# Altium schematic symbol library jlcpcb_2025_04_capacitors_extended_1206.schlib: 2503 symbols (part 6 of 14) (continued)
## CC1206FRNPO9BN471
designator C?  Capacitance: 470pF  (hidden comment: *)
Capacitor, Ceramic (MLCC), 470pF, ±1%, 50V, NP0, ±1%, SMD 1206; Manufacturer: YAGEO; Manufacturer Part Number: CC1206FRNPO9BN471; Package Size: 1206; JLCPCB Basic Part: No; JLCPCB Part Number: C541587; Supplier 1: LCSC; Category: Capacitors - MLCC; Supplier Part Number 1: C541587; Tolerance: ±1%; Voltage Rating: 50V; Temperature Coefficient: NP0; RoHS: Yes; ComponentLink1Description: Datasheet; ComponentLink1URL: https://wmsc.lcsc.com/wmsc/upload/file/pdf/v2/lcsc/2006151213_YAGEO-CC1206FRNPO9BN471_C541587.pdf; ComponentLink2Description: JLCPCB Part URL; ComponentLink2URL: https://jlcpcb.com/partdetail/C541587; ComponentLink3Description: LCSC Part URL; ComponentLink3URL: https://lcsc.com/product-detail/Multilayer-Ceramic-Capacitors-MLCC---SMD-SMT_YAGEO-YAGEO-CC1206FRNPO9BN471_C541587.html
footprint CAP-1206 (1206 (3216M) Capacitor)
pins: 1, 2

## CC1206FRNPO9BN681
designator C?  Capacitance: 680pF  (hidden comment: *)
Capacitor, Ceramic (MLCC), 680pF, 50V, NP0, SMD 1206; Manufacturer: YAGEO; Manufacturer Part Number: CC1206FRNPO9BN681; Package Size: 1206; JLCPCB Basic Part: No; JLCPCB Part Number: C541589; Supplier 1: LCSC; Category: Capacitors - MLCC; Supplier Part Number 1: C541589; Voltage Rating: 50V; Temperature Coefficient: NP0; RoHS: Yes; ComponentLink1Description: Datasheet; ComponentLink1URL: https://wmsc.lcsc.com/wmsc/upload/file/pdf/v2/lcsc/2006151214_YAGEO-CC1206FRNPO9BN681_C541589.pdf; ComponentLink2Description: JLCPCB Part URL; ComponentLink2URL: https://jlcpcb.com/partdetail/C541589; ComponentLink3Description: LCSC Part URL; ComponentLink3URL: https://lcsc.com/product-detail/Multilayer-Ceramic-Capacitors-MLCC---SMD-SMT_YAGEO-YAGEO-CC1206FRNPO9BN681_C541589.html
footprint CAP-1206 (1206 (3216M) Capacitor)
pins: 1, 2

## CC1206GRNPO0BN102
designator C?  Capacitance: 1nF  (hidden comment: *)
Capacitor, Ceramic (MLCC), 1nF, ±2%, 100V, NP0, ±2%, SMD 1206; Manufacturer: YAGEO; Manufacturer Part Number: CC1206GRNPO0BN102; Package Size: 1206; JLCPCB Basic Part: No; JLCPCB Part Number: C527244; Supplier 1: LCSC; Category: Capacitors - MLCC; Supplier Part Number 1: C527244; Tolerance: ±2%; Voltage Rating: 100V; Temperature Coefficient: NP0; RoHS: Yes; ComponentLink1Description: Datasheet; ComponentLink1URL: https://wmsc.lcsc.com/wmsc/upload/file/pdf/v2/lcsc/2006181535_YAGEO-CC1206GRNPO0BN102_C527244.pdf; ComponentLink2Description: JLCPCB Part URL; ComponentLink2URL: https://jlcpcb.com/partdetail/C527244; ComponentLink3Description: LCSC Part URL; ComponentLink3URL: https://lcsc.com/product-detail/Multilayer-Ceramic-Capacitors-MLCC---SMD-SMT_YAGEO-YAGEO-CC1206GRNPO0BN102_C527244.html
footprint CAP-1206 (1206 (3216M) Capacitor)
pins: 1, 2

## CC1206GRNPO0BN222
designator C?  Capacitance: 2.2nF  (hidden comment: *)
Capacitor, Ceramic (MLCC), 2.2nF, ±2%, 100V, NP0, ±2%, SMD 1206; Manufacturer: YAGEO; Manufacturer Part Number: CC1206GRNPO0BN222; Package Size: 1206; JLCPCB Basic Part: No; JLCPCB Part Number: C527245; Supplier 1: LCSC; Category: Capacitors - MLCC; Supplier Part Number 1: C527245; Tolerance: ±2%; Voltage Rating: 100V; Temperature Coefficient: NP0; RoHS: Yes; ComponentLink1Description: Datasheet; ComponentLink1URL: https://wmsc.lcsc.com/wmsc/upload/file/pdf/v2/lcsc/2005261833_YAGEO-CC1206GRNPO0BN222_C527245.pdf; ComponentLink2Description: JLCPCB Part URL; ComponentLink2URL: https://jlcpcb.com/partdetail/C527245; ComponentLink3Description: LCSC Part URL; ComponentLink3URL: https://lcsc.com/product-detail/Multilayer-Ceramic-Capacitors-MLCC---SMD-SMT_YAGEO-YAGEO-CC1206GRNPO0BN222_C527245.html
footprint CAP-1206 (1206 (3216M) Capacitor)
pins: 1, 2

## CC1206GRNPO9BN100
designator C?  Capacitance: 10pF  (hidden comment: *)
Capacitor, Ceramic (MLCC), 10pF, ±2%, 50V, NP0, ±2%, SMD 1206; Manufacturer: YAGEO; Manufacturer Part Number: CC1206GRNPO9BN100; Package Size: 1206; JLCPCB Basic Part: No; JLCPCB Part Number: C541505; Supplier 1: LCSC; Category: Capacitors - MLCC; Supplier Part Number 1: C541505; Tolerance: ±2%; Voltage Rating: 50V; Temperature Coefficient: NP0; RoHS: Yes; ComponentLink1Description: Datasheet; ComponentLink1URL: https://wmsc.lcsc.com/wmsc/upload/file/pdf/v2/lcsc/2006151141_YAGEO-CC1206GRNPO9BN100_C541505.pdf; ComponentLink2Description: JLCPCB Part URL; ComponentLink2URL: https://jlcpcb.com/partdetail/C541505; ComponentLink3Description: LCSC Part URL; ComponentLink3URL: https://lcsc.com/product-detail/Multilayer-Ceramic-Capacitors-MLCC---SMD-SMT_YAGEO-YAGEO-CC1206GRNPO9BN100_C541505.html
footprint CAP-1206 (1206 (3216M) Capacitor)
pins: 1, 2

## CC1206GRNPO9BN101
designator C?  Capacitance: 100pF  (hidden comment: *)
Capacitor, Ceramic (MLCC), 100pF, ±2%, 50V, NP0, ±2%, SMD 1206; Manufacturer: YAGEO; Manufacturer Part Number: CC1206GRNPO9BN101; Package Size: 1206; JLCPCB Basic Part: No; JLCPCB Part Number: C527246; Supplier 1: LCSC; Category: Capacitors - MLCC; Supplier Part Number 1: C527246; Tolerance: ±2%; Voltage Rating: 50V; Temperature Coefficient: NP0; RoHS: Yes; ComponentLink1Description: Datasheet; ComponentLink1URL: https://wmsc.lcsc.com/wmsc/upload/file/pdf/v2/lcsc/2008061533_YAGEO-CC1206GRNPO9BN101_C527246.pdf; ComponentLink2Description: JLCPCB Part URL; ComponentLink2URL: https://jlcpcb.com/partdetail/C527246; ComponentLink3Description: LCSC Part URL; ComponentLink3URL: https://lcsc.com/product-detail/Multilayer-Ceramic-Capacitors-MLCC---SMD-SMT_YAGEO-YAGEO-CC1206GRNPO9BN101_C527246.html
footprint CAP-1206 (1206 (3216M) Capacitor)
pins: 1, 2

## CC1206GRNPO9BN102
designator C?  Capacitance: 1nF  (hidden comment: *)
Capacitor, Ceramic (MLCC), 1nF, ±2%, 50V, NP0, ±2%, SMD 1206; Manufacturer: YAGEO; Manufacturer Part Number: CC1206GRNPO9BN102; Package Size: 1206; JLCPCB Basic Part: No; JLCPCB Part Number: C527247; Supplier 1: LCSC; Category: Capacitors - MLCC; Supplier Part Number 1: C527247; Tolerance: ±2%; Voltage Rating: 50V; Temperature Coefficient: NP0; RoHS: Yes; ComponentLink1Description: Datasheet; ComponentLink1URL: https://wmsc.lcsc.com/wmsc/upload/file/pdf/v2/lcsc/2005222142_YAGEO-CC1206GRNPO9BN102_C527247.pdf; ComponentLink2Description: JLCPCB Part URL; ComponentLink2URL: https://jlcpcb.com/partdetail/C527247; ComponentLink3Description: LCSC Part URL; ComponentLink3URL: https://lcsc.com/product-detail/Multilayer-Ceramic-Capacitors-MLCC---SMD-SMT_YAGEO-YAGEO-CC1206GRNPO9BN102_C527247.html
footprint CAP-1206 (1206 (3216M) Capacitor)
pins: 1, 2

## CC1206GRNPO9BN122
designator C?  Capacitance: 1.2nF  (hidden comment: *)
Capacitor, Ceramic (MLCC), 1.2nF, ±2%, 50V, NP0, ±2%, SMD 1206; Manufacturer: YAGEO; Manufacturer Part Number: CC1206GRNPO9BN122; Package Size: 1206; JLCPCB Basic Part: No; JLCPCB Part Number: C527248; Supplier 1: LCSC; Category: Capacitors - MLCC; Supplier Part Number 1: C527248; Tolerance: ±2%; Voltage Rating: 50V; Temperature Coefficient: NP0; RoHS: Yes; ComponentLink1Description: Datasheet; ComponentLink1URL: https://wmsc.lcsc.com/wmsc/upload/file/pdf/v2/lcsc/2006181535_YAGEO-CC1206GRNPO9BN122_C527248.pdf; ComponentLink2Description: JLCPCB Part URL; ComponentLink2URL: https://jlcpcb.com/partdetail/C527248; ComponentLink3Description: LCSC Part URL; ComponentLink3URL: https://lcsc.com/product-detail/Multilayer-Ceramic-Capacitors-MLCC---SMD-SMT_YAGEO-YAGEO-CC1206GRNPO9BN122_C527248.html
footprint CAP-1206 (1206 (3216M) Capacitor)
pins: 1, 2

## CC1206GRNPO9BN152
designator C?  Capacitance: 1.5nF  (hidden comment: *)
Capacitor, Ceramic (MLCC), 1.5nF, ±2%, 50V, NP0, ±2%, SMD 1206; Manufacturer: YAGEO; Manufacturer Part Number: CC1206GRNPO9BN152; Package Size: 1206; JLCPCB Basic Part: No; JLCPCB Part Number: C527249; Supplier 1: LCSC; Category: Capacitors - MLCC; Supplier Part Number 1: C527249; Tolerance: ±2%; Voltage Rating: 50V; Temperature Coefficient: NP0; RoHS: Yes; ComponentLink1Description: Datasheet; ComponentLink1URL: https://wmsc.lcsc.com/wmsc/upload/file/pdf/v2/lcsc/2007021836_YAGEO-CC1206GRNPO9BN152_C527249.pdf; ComponentLink2Description: JLCPCB Part URL; ComponentLink2URL: https://jlcpcb.com/partdetail/C527249; ComponentLink3Description: LCSC Part URL; ComponentLink3URL: https://lcsc.com/product-detail/Multilayer-Ceramic-Capacitors-MLCC---SMD-SMT_YAGEO-YAGEO-CC1206GRNPO9BN152_C527249.html
footprint CAP-1206 (1206 (3216M) Capacitor)
pins: 1, 2

## CC1206GRNPO9BN181
designator C?  Capacitance: 180pF  (hidden comment: *)
Capacitor, Ceramic (MLCC), 180pF, ±2%, 50V, NP0, ±2%, SMD 1206; Manufacturer: YAGEO; Manufacturer Part Number: CC1206GRNPO9BN181; Package Size: 1206; JLCPCB Basic Part: No; JLCPCB Part Number: C577104; Supplier 1: LCSC; Category: Capacitors - MLCC; Supplier Part Number 1: C577104; Tolerance: ±2%; Voltage Rating: 50V; Temperature Coefficient: NP0; RoHS: Yes; ComponentLink1Description: Datasheet; ComponentLink1URL: https://wmsc.lcsc.com/wmsc/upload/file/pdf/v2/lcsc/2311211121_YAGEO-CC1206GRNPO9BN181_C577104.pdf; ComponentLink2Description: JLCPCB Part URL; ComponentLink2URL: https://jlcpcb.com/partdetail/C577104; ComponentLink3Description: LCSC Part URL; ComponentLink3URL: https://lcsc.com/product-detail/Multilayer-Ceramic-Capacitors-MLCC---SMD-SMT_YAGEO-YAGEO-CC1206GRNPO9BN181_C577104.html
footprint CAP-1206 (1206 (3216M) Capacitor)
pins: 1, 2

## CC1206GRNPO9BN182
designator C?  Capacitance: 1.8nF  (hidden comment: *)
Capacitor, Ceramic (MLCC), 1.8nF, ±2%, 50V, NP0, ±2%, SMD 1206; Manufacturer: YAGEO; Manufacturer Part Number: CC1206GRNPO9BN182; Package Size: 1206; JLCPCB Basic Part: No; JLCPCB Part Number: C527250; Supplier 1: LCSC; Category: Capacitors - MLCC; Supplier Part Number 1: C527250; Tolerance: ±2%; Voltage Rating: 50V; Temperature Coefficient: NP0; RoHS: Yes; ComponentLink1Description: Datasheet; ComponentLink1URL: https://wmsc.lcsc.com/wmsc/upload/file/pdf/v2/lcsc/2006031835_YAGEO-CC1206GRNPO9BN182_C527250.pdf; ComponentLink2Description: JLCPCB Part URL; ComponentLink2URL: https://jlcpcb.com/partdetail/C527250; ComponentLink3Description: LCSC Part URL; ComponentLink3URL: https://lcsc.com/product-detail/Multilayer-Ceramic-Capacitors-MLCC---SMD-SMT_YAGEO-YAGEO-CC1206GRNPO9BN182_C527250.html
footprint CAP-1206 (1206 (3216M) Capacitor)
pins: 1, 2

## CC1206GRNPO9BN220
designator C?  Capacitance: 22pF  (hidden comment: *)
Capacitor, Ceramic (MLCC), 22pF, ±2%, 50V, NP0, ±2%, SMD 1206; Manufacturer: YAGEO; Manufacturer Part Number: CC1206GRNPO9BN220; Package Size: 1206; JLCPCB Basic Part: No; JLCPCB Part Number: C527251; Supplier 1: LCSC; Category: Capacitors - MLCC; Supplier Part Number 1: C527251; Tolerance: ±2%; Voltage Rating: 50V; Temperature Coefficient: NP0; RoHS: Yes; ComponentLink1Description: Datasheet; ComponentLink1URL: https://wmsc.lcsc.com/wmsc/upload/file/pdf/v2/lcsc/2007221234_YAGEO-CC1206GRNPO9BN220_C527251.pdf; ComponentLink2Description: JLCPCB Part URL; ComponentLink2URL: https://jlcpcb.com/partdetail/C527251; ComponentLink3Description: LCSC Part URL; ComponentLink3URL: https://lcsc.com/product-detail/Multilayer-Ceramic-Capacitors-MLCC---SMD-SMT_YAGEO-YAGEO-CC1206GRNPO9BN220_C527251.html
footprint CAP-1206 (1206 (3216M) Capacitor)
pins: 1, 2

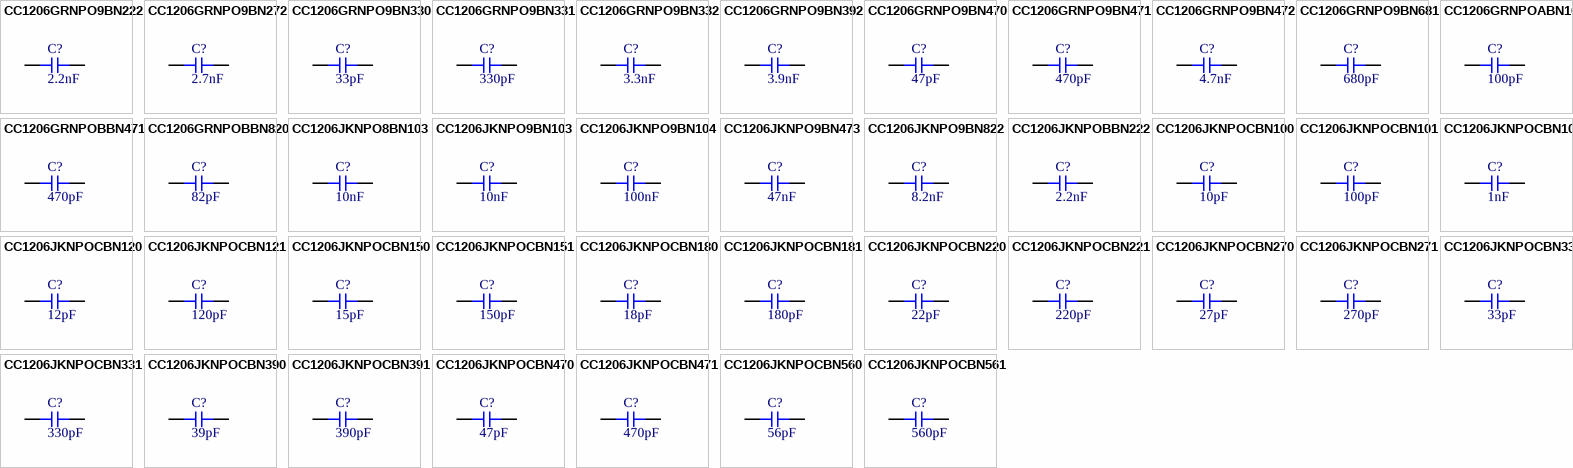
[diagram p24: symbols CC1206GRNPO9BN222 to CC1206JKNPOCBN561]

## CC1206GRNPO9BN222
designator C?  Capacitance: 2.2nF  (hidden comment: *)
Capacitor, Ceramic (MLCC), 2.2nF, ±2%, 50V, NP0, ±2%, SMD 1206; Manufacturer: YAGEO; Manufacturer Part Number: CC1206GRNPO9BN222; Package Size: 1206; JLCPCB Basic Part: No; JLCPCB Part Number: C527252; Supplier 1: LCSC; Category: Capacitors - MLCC; Supplier Part Number 1: C527252; Tolerance: ±2%; Voltage Rating: 50V; Temperature Coefficient: NP0; RoHS: Yes; ComponentLink1Description: Datasheet; ComponentLink1URL: https://wmsc.lcsc.com/wmsc/upload/file/pdf/v2/lcsc/2007301233_YAGEO-CC1206GRNPO9BN222_C527252.pdf; ComponentLink2Description: JLCPCB Part URL; ComponentLink2URL: https://jlcpcb.com/partdetail/C527252; ComponentLink3Description: LCSC Part URL; ComponentLink3URL: https://lcsc.com/product-detail/Multilayer-Ceramic-Capacitors-MLCC---SMD-SMT_YAGEO-YAGEO-CC1206GRNPO9BN222_C527252.html
footprint CAP-1206 (1206 (3216M) Capacitor)
pins: 1, 2

## CC1206GRNPO9BN272
designator C?  Capacitance: 2.7nF  (hidden comment: *)
Capacitor, Ceramic (MLCC), 2.7nF, ±2%, 50V, NP0, ±2%, SMD 1206; Manufacturer: YAGEO; Manufacturer Part Number: CC1206GRNPO9BN272; Package Size: 1206; JLCPCB Basic Part: No; JLCPCB Part Number: C541510; Supplier 1: LCSC; Category: Capacitors - MLCC; Supplier Part Number 1: C541510; Tolerance: ±2%; Voltage Rating: 50V; Temperature Coefficient: NP0; RoHS: Yes; ComponentLink1Description: Datasheet; ComponentLink1URL: https://wmsc.lcsc.com/wmsc/upload/file/pdf/v2/lcsc/2006151142_YAGEO-CC1206GRNPO9BN272_C541510.pdf; ComponentLink2Description: JLCPCB Part URL; ComponentLink2URL: https://jlcpcb.com/partdetail/C541510; ComponentLink3Description: LCSC Part URL; ComponentLink3URL: https://lcsc.com/product-detail/Multilayer-Ceramic-Capacitors-MLCC---SMD-SMT_YAGEO-YAGEO-CC1206GRNPO9BN272_C541510.html
footprint CAP-1206 (1206 (3216M) Capacitor)
pins: 1, 2

## CC1206GRNPO9BN330
designator C?  Capacitance: 33pF  (hidden comment: *)
Capacitor, Ceramic (MLCC), 33pF, ±2%, 50V, NP0, ±2%, SMD 1206; Manufacturer: YAGEO; Manufacturer Part Number: CC1206GRNPO9BN330; Package Size: 1206; JLCPCB Basic Part: No; JLCPCB Part Number: C541508; Supplier 1: LCSC; Category: Capacitors - MLCC; Supplier Part Number 1: C541508; Tolerance: ±2%; Voltage Rating: 50V; Temperature Coefficient: NP0; RoHS: Yes; ComponentLink1Description: Datasheet; ComponentLink1URL: https://wmsc.lcsc.com/wmsc/upload/file/pdf/v2/lcsc/2006151141_YAGEO-CC1206GRNPO9BN330_C541508.pdf; ComponentLink2Description: JLCPCB Part URL; ComponentLink2URL: https://jlcpcb.com/partdetail/C541508; ComponentLink3Description: LCSC Part URL; ComponentLink3URL: https://lcsc.com/product-detail/Multilayer-Ceramic-Capacitors-MLCC---SMD-SMT_YAGEO-YAGEO-CC1206GRNPO9BN330_C541508.html
footprint CAP-1206 (1206 (3216M) Capacitor)
pins: 1, 2

## CC1206GRNPO9BN331
designator C?  Capacitance: 330pF  (hidden comment: *)
Capacitor, Ceramic (MLCC), 330pF, ±2%, 50V, NP0, ±2%, SMD 1206; Manufacturer: YAGEO; Manufacturer Part Number: CC1206GRNPO9BN331; Package Size: 1206; JLCPCB Basic Part: No; JLCPCB Part Number: C527253; Supplier 1: LCSC; Category: Capacitors - MLCC; Supplier Part Number 1: C527253; Tolerance: ±2%; Voltage Rating: 50V; Temperature Coefficient: NP0; RoHS: Yes; ComponentLink1Description: Datasheet; ComponentLink1URL: https://wmsc.lcsc.com/wmsc/upload/file/pdf/v2/lcsc/2007021837_YAGEO-CC1206GRNPO9BN331_C527253.pdf; ComponentLink2Description: JLCPCB Part URL; ComponentLink2URL: https://jlcpcb.com/partdetail/C527253; ComponentLink3Description: LCSC Part URL; ComponentLink3URL: https://lcsc.com/product-detail/Multilayer-Ceramic-Capacitors-MLCC---SMD-SMT_YAGEO-YAGEO-CC1206GRNPO9BN331_C527253.html
footprint CAP-1206 (1206 (3216M) Capacitor)
pins: 1, 2

## CC1206GRNPO9BN332
designator C?  Capacitance: 3.3nF  (hidden comment: *)
Capacitor, Ceramic (MLCC), 3.3nF, ±2%, 50V, NP0, ±2%, SMD 1206; Manufacturer: YAGEO; Manufacturer Part Number: CC1206GRNPO9BN332; Package Size: 1206; JLCPCB Basic Part: No; JLCPCB Part Number: C541559; Supplier 1: LCSC; Category: Capacitors - MLCC; Supplier Part Number 1: C541559; Tolerance: ±2%; Voltage Rating: 50V; Temperature Coefficient: NP0; RoHS: Yes; ComponentLink1Description: Datasheet; ComponentLink1URL: https://wmsc.lcsc.com/wmsc/upload/file/pdf/v2/lcsc/2006151212_YAGEO-CC1206GRNPO9BN332_C541559.pdf; ComponentLink2Description: JLCPCB Part URL; ComponentLink2URL: https://jlcpcb.com/partdetail/C541559; ComponentLink3Description: LCSC Part URL; ComponentLink3URL: https://lcsc.com/product-detail/Multilayer-Ceramic-Capacitors-MLCC---SMD-SMT_YAGEO-YAGEO-CC1206GRNPO9BN332_C541559.html
footprint CAP-1206 (1206 (3216M) Capacitor)
pins: 1, 2

## CC1206GRNPO9BN392
designator C?  Capacitance: 3.9nF  (hidden comment: *)
Capacitor, Ceramic (MLCC), 3.9nF, ±2%, 50V, NP0, ±2%, SMD 1206; Manufacturer: YAGEO; Manufacturer Part Number: CC1206GRNPO9BN392; Package Size: 1206; JLCPCB Basic Part: No; JLCPCB Part Number: C541560; Supplier 1: LCSC; Category: Capacitors - MLCC; Supplier Part Number 1: C541560; Tolerance: ±2%; Voltage Rating: 50V; Temperature Coefficient: NP0; RoHS: Yes; ComponentLink1Description: Datasheet; ComponentLink1URL: https://wmsc.lcsc.com/wmsc/upload/file/pdf/v2/lcsc/2006151212_YAGEO-CC1206GRNPO9BN392_C541560.pdf; ComponentLink2Description: JLCPCB Part URL; ComponentLink2URL: https://jlcpcb.com/partdetail/C541560; ComponentLink3Description: LCSC Part URL; ComponentLink3URL: https://lcsc.com/product-detail/Multilayer-Ceramic-Capacitors-MLCC---SMD-SMT_YAGEO-YAGEO-CC1206GRNPO9BN392_C541560.html
footprint CAP-1206 (1206 (3216M) Capacitor)
pins: 1, 2

## CC1206GRNPO9BN470
designator C?  Capacitance: 47pF  (hidden comment: *)
Capacitor, Ceramic (MLCC), 47pF, ±2%, 50V, NP0, ±2%, SMD 1206; Manufacturer: YAGEO; Manufacturer Part Number: CC1206GRNPO9BN470; Package Size: 1206; JLCPCB Basic Part: No; JLCPCB Part Number: C527254; Supplier 1: LCSC; Category: Capacitors - MLCC; Supplier Part Number 1: C527254; Tolerance: ±2%; Voltage Rating: 50V; Temperature Coefficient: NP0; RoHS: Yes; ComponentLink1Description: Datasheet; ComponentLink1URL: https://wmsc.lcsc.com/wmsc/upload/file/pdf/v2/lcsc/2007221234_YAGEO-CC1206GRNPO9BN470_C527254.pdf; ComponentLink2Description: JLCPCB Part URL; ComponentLink2URL: https://jlcpcb.com/partdetail/C527254; ComponentLink3Description: LCSC Part URL; ComponentLink3URL: https://lcsc.com/product-detail/Multilayer-Ceramic-Capacitors-MLCC---SMD-SMT_YAGEO-YAGEO-CC1206GRNPO9BN470_C527254.html
footprint CAP-1206 (1206 (3216M) Capacitor)
pins: 1, 2

## CC1206GRNPO9BN471
designator C?  Capacitance: 470pF  (hidden comment: *)
Capacitor, Ceramic (MLCC), 470pF, ±2%, 50V, NP0, ±2%, SMD 1206; Manufacturer: YAGEO; Manufacturer Part Number: CC1206GRNPO9BN471; Package Size: 1206; JLCPCB Basic Part: No; JLCPCB Part Number: C527255; Supplier 1: LCSC; Category: Capacitors - MLCC; Supplier Part Number 1: C527255; Tolerance: ±2%; Voltage Rating: 50V; Temperature Coefficient: NP0; RoHS: Yes; ComponentLink1Description: Datasheet; ComponentLink1URL: https://wmsc.lcsc.com/wmsc/upload/file/pdf/v2/lcsc/2008061533_YAGEO-CC1206GRNPO9BN471_C527255.pdf; ComponentLink2Description: JLCPCB Part URL; ComponentLink2URL: https://jlcpcb.com/partdetail/C527255; ComponentLink3Description: LCSC Part URL; ComponentLink3URL: https://lcsc.com/product-detail/Multilayer-Ceramic-Capacitors-MLCC---SMD-SMT_YAGEO-YAGEO-CC1206GRNPO9BN471_C527255.html
footprint CAP-1206 (1206 (3216M) Capacitor)
pins: 1, 2

## CC1206GRNPO9BN472
designator C?  Capacitance: 4.7nF  (hidden comment: *)
Capacitor, Ceramic (MLCC), 4.7nF, ±2%, 50V, NP0, ±2%, SMD 1206; Manufacturer: YAGEO; Manufacturer Part Number: CC1206GRNPO9BN472; Package Size: 1206; JLCPCB Basic Part: No; JLCPCB Part Number: C541561; Supplier 1: LCSC; Category: Capacitors - MLCC; Supplier Part Number 1: C541561; Tolerance: ±2%; Voltage Rating: 50V; Temperature Coefficient: NP0; RoHS: Yes; ComponentLink1Description: Datasheet; ComponentLink1URL: https://wmsc.lcsc.com/wmsc/upload/file/pdf/v2/lcsc/2006151212_YAGEO-CC1206GRNPO9BN472_C541561.pdf; ComponentLink2Description: JLCPCB Part URL; ComponentLink2URL: https://jlcpcb.com/partdetail/C541561; ComponentLink3Description: LCSC Part URL; ComponentLink3URL: https://lcsc.com/product-detail/Multilayer-Ceramic-Capacitors-MLCC---SMD-SMT_YAGEO-YAGEO-CC1206GRNPO9BN472_C541561.html
footprint CAP-1206 (1206 (3216M) Capacitor)
pins: 1, 2

## CC1206GRNPO9BN681
designator C?  Capacitance: 680pF  (hidden comment: *)
Capacitor, Ceramic (MLCC), 680pF, ±2%, 50V, NP0, ±2%, SMD 1206; Manufacturer: YAGEO; Manufacturer Part Number: CC1206GRNPO9BN681; Package Size: 1206; JLCPCB Basic Part: No; JLCPCB Part Number: C527256; Supplier 1: LCSC; Category: Capacitors - MLCC; Supplier Part Number 1: C527256; Tolerance: ±2%; Voltage Rating: 50V; Temperature Coefficient: NP0; RoHS: Yes; ComponentLink1Description: Datasheet; ComponentLink1URL: https://wmsc.lcsc.com/wmsc/upload/file/pdf/v2/lcsc/2005261833_YAGEO-CC1206GRNPO9BN681_C527256.pdf; ComponentLink2Description: JLCPCB Part URL; ComponentLink2URL: https://jlcpcb.com/partdetail/C527256; ComponentLink3Description: LCSC Part URL; ComponentLink3URL: https://lcsc.com/product-detail/Multilayer-Ceramic-Capacitors-MLCC---SMD-SMT_YAGEO-YAGEO-CC1206GRNPO9BN681_C527256.html
footprint CAP-1206 (1206 (3216M) Capacitor)
pins: 1, 2

## CC1206GRNPOABN101
designator C?  Capacitance: 100pF  (hidden comment: *)
Capacitor, Ceramic (MLCC), 100pF, ±2%, 200V, NP0, ±2%, SMD 1206; Manufacturer: YAGEO; Manufacturer Part Number: CC1206GRNPOABN101; Package Size: 1206; JLCPCB Basic Part: No; JLCPCB Part Number: C527257; Supplier 1: LCSC; Category: Capacitors - MLCC; Supplier Part Number 1: C527257; Tolerance: ±2%; Voltage Rating: 200V; Temperature Coefficient: NP0; RoHS: Yes; ComponentLink1Description: Datasheet; ComponentLink1URL: https://wmsc.lcsc.com/wmsc/upload/file/pdf/v2/lcsc/2007021837_YAGEO-CC1206GRNPOABN101_C527257.pdf; ComponentLink2Description: JLCPCB Part URL; ComponentLink2URL: https://jlcpcb.com/partdetail/C527257; ComponentLink3Description: LCSC Part URL; ComponentLink3URL: https://lcsc.com/product-detail/Multilayer-Ceramic-Capacitors-MLCC---SMD-SMT_YAGEO-YAGEO-CC1206GRNPOABN101_C527257.html
footprint CAP-1206 (1206 (3216M) Capacitor)
pins: 1, 2

## CC1206GRNPOBBN471
designator C?  Capacitance: 470pF  (hidden comment: *)
Capacitor, Ceramic (MLCC), 470pF, ±2%, 500V, NP0, ±2%, SMD 1206; Manufacturer: YAGEO; Manufacturer Part Number: CC1206GRNPOBBN471; Package Size: 1206; JLCPCB Basic Part: No; JLCPCB Part Number: C309496; Supplier 1: LCSC; Category: Capacitors - MLCC; Supplier Part Number 1: C309496; Tolerance: ±2%; Voltage Rating: 500V; Temperature Coefficient: NP0; RoHS: Yes; ComponentLink1Description: Datasheet; ComponentLink1URL: https://wmsc.lcsc.com/wmsc/upload/file/pdf/v2/lcsc/2304140030_YAGEO-CC1206GRNPOBBN471_C309496.pdf; ComponentLink2Description: JLCPCB Part URL; ComponentLink2URL: https://jlcpcb.com/partdetail/C309496; ComponentLink3Description: LCSC Part URL; ComponentLink3URL: https://lcsc.com/product-detail/Multilayer-Ceramic-Capacitors-MLCC---SMD-SMT_YAGEO-YAGEO-CC1206GRNPOBBN471_C309496.html
footprint CAP-1206 (1206 (3216M) Capacitor)
pins: 1, 2

## CC1206GRNPOBBN820
designator C?  Capacitance: 82pF  (hidden comment: *)
Capacitor, Ceramic (MLCC), 82pF, ±2%, 500V, NP0, ±2%, SMD 1206; Manufacturer: YAGEO; Manufacturer Part Number: CC1206GRNPOBBN820; Package Size: 1206; JLCPCB Basic Part: No; JLCPCB Part Number: C527258; Supplier 1: LCSC; Category: Capacitors - MLCC; Supplier Part Number 1: C527258; Tolerance: ±2%; Voltage Rating: 500V; Temperature Coefficient: NP0; RoHS: Yes; ComponentLink1Description: Datasheet; ComponentLink1URL: https://wmsc.lcsc.com/wmsc/upload/file/pdf/v2/lcsc/2007301233_YAGEO-CC1206GRNPOBBN820_C527258.pdf; ComponentLink2Description: JLCPCB Part URL; ComponentLink2URL: https://jlcpcb.com/partdetail/C527258; ComponentLink3Description: LCSC Part URL; ComponentLink3URL: https://lcsc.com/product-detail/Multilayer-Ceramic-Capacitors-MLCC---SMD-SMT_YAGEO-YAGEO-CC1206GRNPOBBN820_C527258.html
footprint CAP-1206 (1206 (3216M) Capacitor)
pins: 1, 2

## CC1206JKNPO8BN103
designator C?  Capacitance: 10nF  (hidden comment: *)
Capacitor, Ceramic (MLCC), 10nF, ±5%, 25V, NP0, ±5%, SMD 1206; Manufacturer: YAGEO; Manufacturer Part Number: CC1206JKNPO8BN103; Package Size: 1206; JLCPCB Basic Part: No; JLCPCB Part Number: C541480; Supplier 1: LCSC; Category: Capacitors - MLCC; Supplier Part Number 1: C541480; Tolerance: ±5%; Voltage Rating: 25V; Temperature Coefficient: NP0; RoHS: Yes; ComponentLink1Description: Datasheet; ComponentLink1URL: https://wmsc.lcsc.com/wmsc/upload/file/pdf/v2/lcsc/2006151139_YAGEO-CC1206JKNPO8BN103_C541480.pdf; ComponentLink2Description: JLCPCB Part URL; ComponentLink2URL: https://jlcpcb.com/partdetail/C541480; ComponentLink3Description: LCSC Part URL; ComponentLink3URL: https://lcsc.com/product-detail/Multilayer-Ceramic-Capacitors-MLCC---SMD-SMT_YAGEO-YAGEO-CC1206JKNPO8BN103_C541480.html
footprint CAP-1206 (1206 (3216M) Capacitor)
pins: 1, 2

## CC1206JKNPO9BN103
designator C?  Capacitance: 10nF  (hidden comment: *)
Capacitor, Ceramic (MLCC), 10nF, ±5%, 50V, NP0, ±5%, SMD 1206; Manufacturer: YAGEO; Manufacturer Part Number: CC1206JKNPO9BN103; Package Size: 1206; JLCPCB Basic Part: No; JLCPCB Part Number: C326648; Supplier 1: LCSC; Category: Capacitors - MLCC; Supplier Part Number 1: C326648; Tolerance: ±5%; Voltage Rating: 50V; Temperature Coefficient: NP0; RoHS: Yes; ComponentLink1Description: Datasheet; ComponentLink1URL: https://wmsc.lcsc.com/wmsc/upload/file/pdf/v2/lcsc/1811141242_YAGEO-CC1206JKNPO9BN103_C326648.pdf; ComponentLink2Description: JLCPCB Part URL; ComponentLink2URL: https://jlcpcb.com/partdetail/C326648; ComponentLink3Description: LCSC Part URL; ComponentLink3URL: https://lcsc.com/product-detail/Multilayer-Ceramic-Capacitors-MLCC---SMD-SMT_YAGEO-YAGEO-CC1206JKNPO9BN103_C326648.html
footprint CAP-1206 (1206 (3216M) Capacitor)
pins: 1, 2

## CC1206JKNPO9BN104
designator C?  Capacitance: 100nF  (hidden comment: *)
Capacitor, Ceramic (MLCC), 100nF, ±5%, 50V, NP0, ±5%, SMD 1206; Manufacturer: YAGEO; Manufacturer Part Number: CC1206JKNPO9BN104; Package Size: 1206; JLCPCB Basic Part: No; JLCPCB Part Number: C577121; Supplier 1: LCSC; Category: Capacitors - MLCC; Supplier Part Number 1: C577121; Tolerance: ±5%; Voltage Rating: 50V; Temperature Coefficient: NP0; RoHS: Yes; ComponentLink1Description: Datasheet; ComponentLink1URL: https://wmsc.lcsc.com/wmsc/upload/file/pdf/v2/lcsc/2204271615_YAGEO-CC1206JKNPO9BN104_C577121.pdf; ComponentLink2Description: JLCPCB Part URL; ComponentLink2URL: https://jlcpcb.com/partdetail/C577121; ComponentLink3Description: LCSC Part URL; ComponentLink3URL: https://lcsc.com/product-detail/Multilayer-Ceramic-Capacitors-MLCC---SMD-SMT_YAGEO-YAGEO-CC1206JKNPO9BN104_C577121.html
footprint CAP-1206 (1206 (3216M) Capacitor)
pins: 1, 2

## CC1206JKNPO9BN473
designator C?  Capacitance: 47nF  (hidden comment: *)
Capacitor, Ceramic (MLCC), 47nF, ±5%, 50V, C0G, ±5%, SMD 1206; Manufacturer: YAGEO; Manufacturer Part Number: CC1206JKNPO9BN473; Package Size: 1206; JLCPCB Basic Part: No; JLCPCB Part Number: C3855647; Supplier 1: LCSC; Category: Capacitors - MLCC; Supplier Part Number 1: C3855647; Tolerance: ±5%; Voltage Rating: 50V; Temperature Coefficient: C0G; RoHS: Yes; ComponentLink1Description: Datasheet; ComponentLink1URL: https://wmsc.lcsc.com/wmsc/upload/file/pdf/v2/lcsc/2311211121_YAGEO-CC1206JKNPO9BN473_C3855647.pdf; ComponentLink2Description: JLCPCB Part URL; ComponentLink2URL: https://jlcpcb.com/partdetail/C3855647; ComponentLink3Description: LCSC Part URL; ComponentLink3URL: https://lcsc.com/product-detail/Multilayer-Ceramic-Capacitors-MLCC---SMD-SMT_YAGEO-YAGEO-CC1206JKNPO9BN473_C3855647.html
footprint CAP-1206 (1206 (3216M) Capacitor)
pins: 1, 2

## CC1206JKNPO9BN822
designator C?  Capacitance: 8.2nF  (hidden comment: *)
Capacitor, Ceramic (MLCC), 8.2nF, ±5%, 50V, NP0, ±5%, SMD 1206; Manufacturer: YAGEO; Manufacturer Part Number: CC1206JKNPO9BN822; Package Size: 1206; JLCPCB Basic Part: No; JLCPCB Part Number: C527260; Supplier 1: LCSC; Category: Capacitors - MLCC; Supplier Part Number 1: C527260; Tolerance: ±5%; Voltage Rating: 50V; Temperature Coefficient: NP0; RoHS: Yes; ComponentLink1Description: Datasheet; ComponentLink1URL: https://wmsc.lcsc.com/wmsc/upload/file/pdf/v2/lcsc/2006181535_YAGEO-CC1206JKNPO9BN822_C527260.pdf; ComponentLink2Description: JLCPCB Part URL; ComponentLink2URL: https://jlcpcb.com/partdetail/C527260; ComponentLink3Description: LCSC Part URL; ComponentLink3URL: https://lcsc.com/product-detail/Multilayer-Ceramic-Capacitors-MLCC---SMD-SMT_YAGEO-YAGEO-CC1206JKNPO9BN822_C527260.html
footprint CAP-1206 (1206 (3216M) Capacitor)
pins: 1, 2

## CC1206JKNPOBBN222
designator C?  Capacitance: 2.2nF  (hidden comment: *)
Capacitor, Ceramic (MLCC), 2.2nF, ±5%, 500V, NP0, ±5%, SMD 1206; Manufacturer: YAGEO; Manufacturer Part Number: CC1206JKNPOBBN222; Package Size: 1206; JLCPCB Basic Part: No; JLCPCB Part Number: C527261; Supplier 1: LCSC; Category: Capacitors - MLCC; Supplier Part Number 1: C527261; Tolerance: ±5%; Voltage Rating: 500V; Temperature Coefficient: NP0; RoHS: Yes; ComponentLink1Description: Datasheet; ComponentLink1URL: https://wmsc.lcsc.com/wmsc/upload/file/pdf/v2/lcsc/2007021837_YAGEO-CC1206JKNPOBBN222_C527261.pdf; ComponentLink2Description: JLCPCB Part URL; ComponentLink2URL: https://jlcpcb.com/partdetail/C527261; ComponentLink3Description: LCSC Part URL; ComponentLink3URL: https://lcsc.com/product-detail/Multilayer-Ceramic-Capacitors-MLCC---SMD-SMT_YAGEO-YAGEO-CC1206JKNPOBBN222_C527261.html
footprint CAP-1206 (1206 (3216M) Capacitor)
pins: 1, 2

## CC1206JKNPOCBN100
designator C?  Capacitance: 10pF  (hidden comment: *)
Capacitor, Ceramic (MLCC), 10pF, ±5%, 1kV, NP0, ±5%, SMD 1206; Manufacturer: YAGEO; Manufacturer Part Number: CC1206JKNPOCBN100; Package Size: 1206; JLCPCB Basic Part: No; JLCPCB Part Number: C107172; Supplier 1: LCSC; Category: Capacitors - MLCC; Supplier Part Number 1: C107172; Tolerance: ±5%; Voltage Rating: 1kV; Temperature Coefficient: NP0; RoHS: Yes; ComponentLink1Description: Datasheet; ComponentLink1URL: https://wmsc.lcsc.com/wmsc/upload/file/pdf/v2/lcsc/2304140030_YAGEO-CC1206JKNPOCBN100_C107172.pdf; ComponentLink2Description: JLCPCB Part URL; ComponentLink2URL: https://jlcpcb.com/partdetail/C107172; ComponentLink3Description: LCSC Part URL; ComponentLink3URL: https://lcsc.com/product-detail/Multilayer-Ceramic-Capacitors-MLCC---SMD-SMT_YAGEO-YAGEO-CC1206JKNPOCBN100_C107172.html
footprint CAP-1206 (1206 (3216M) Capacitor)
pins: 1, 2

## CC1206JKNPOCBN101
designator C?  Capacitance: 100pF  (hidden comment: *)
Capacitor, Ceramic (MLCC), 100pF, ±5%, 1kV, NP0, ±5%, SMD 1206; Manufacturer: YAGEO; Manufacturer Part Number: CC1206JKNPOCBN101; Package Size: 1206; JLCPCB Basic Part: No; JLCPCB Part Number: C107173; Supplier 1: LCSC; Category: Capacitors - MLCC; Supplier Part Number 1: C107173; Tolerance: ±5%; Voltage Rating: 1kV; Temperature Coefficient: NP0; RoHS: Yes; ComponentLink1Description: Datasheet; ComponentLink1URL: https://wmsc.lcsc.com/wmsc/upload/file/pdf/v2/lcsc/2304140030_YAGEO-CC1206JKNPOCBN101_C107173.pdf; ComponentLink2Description: JLCPCB Part URL; ComponentLink2URL: https://jlcpcb.com/partdetail/C107173; ComponentLink3Description: LCSC Part URL; ComponentLink3URL: https://lcsc.com/product-detail/Multilayer-Ceramic-Capacitors-MLCC---SMD-SMT_YAGEO-YAGEO-CC1206JKNPOCBN101_C107173.html
footprint CAP-1206 (1206 (3216M) Capacitor)
pins: 1, 2

## CC1206JKNPOCBN102
designator C?  Capacitance: 1nF  (hidden comment: *)
Capacitor, Ceramic (MLCC), 1nF, ±5%, 1kV, NP0, ±5%, SMD 1206; Manufacturer: YAGEO; Manufacturer Part Number: CC1206JKNPOCBN102; Package Size: 1206; JLCPCB Basic Part: No; JLCPCB Part Number: C113872; Supplier 1: LCSC; Category: Capacitors - MLCC; Supplier Part Number 1: C113872; Tolerance: ±5%; Voltage Rating: 1kV; Temperature Coefficient: NP0; RoHS: Yes; ComponentLink1Description: Datasheet; ComponentLink1URL: https://wmsc.lcsc.com/wmsc/upload/file/pdf/v2/lcsc/2304140030_YAGEO-CC1206JKNPOCBN102_C113872.pdf; ComponentLink2Description: JLCPCB Part URL; ComponentLink2URL: https://jlcpcb.com/partdetail/C113872; ComponentLink3Description: LCSC Part URL; ComponentLink3URL: https://lcsc.com/product-detail/Multilayer-Ceramic-Capacitors-MLCC---SMD-SMT_YAGEO-YAGEO-CC1206JKNPOCBN102_C113872.html
footprint CAP-1206 (1206 (3216M) Capacitor)
pins: 1, 2

## CC1206JKNPOCBN120
designator C?  Capacitance: 12pF  (hidden comment: *)
Capacitor, Ceramic (MLCC), 12pF, ±5%, 1kV, NP0, ±5%, SMD 1206; Manufacturer: YAGEO; Manufacturer Part Number: CC1206JKNPOCBN120; Package Size: 1206; JLCPCB Basic Part: No; JLCPCB Part Number: C541491; Supplier 1: LCSC; Category: Capacitors - MLCC; Supplier Part Number 1: C541491; Tolerance: ±5%; Voltage Rating: 1kV; Temperature Coefficient: NP0; RoHS: Yes; ComponentLink1Description: Datasheet; ComponentLink1URL: https://wmsc.lcsc.com/wmsc/upload/file/pdf/v2/lcsc/2006151140_YAGEO-CC1206JKNPOCBN120_C541491.pdf; ComponentLink2Description: JLCPCB Part URL; ComponentLink2URL: https://jlcpcb.com/partdetail/C541491; ComponentLink3Description: LCSC Part URL; ComponentLink3URL: https://lcsc.com/product-detail/Multilayer-Ceramic-Capacitors-MLCC---SMD-SMT_YAGEO-YAGEO-CC1206JKNPOCBN120_C541491.html
footprint CAP-1206 (1206 (3216M) Capacitor)
pins: 1, 2

## CC1206JKNPOCBN121
designator C?  Capacitance: 120pF  (hidden comment: *)
Capacitor, Ceramic (MLCC), 120pF, ±5%, 1kV, NP0, ±5%, SMD 1206; Manufacturer: YAGEO; Manufacturer Part Number: CC1206JKNPOCBN121; Package Size: 1206; JLCPCB Basic Part: No; JLCPCB Part Number: C113873; Supplier 1: LCSC; Category: Capacitors - MLCC; Supplier Part Number 1: C113873; Tolerance: ±5%; Voltage Rating: 1kV; Temperature Coefficient: NP0; RoHS: Yes; ComponentLink1Description: Datasheet; ComponentLink1URL: https://wmsc.lcsc.com/wmsc/upload/file/pdf/v2/lcsc/2304140030_YAGEO-CC1206JKNPOCBN121_C113873.pdf; ComponentLink2Description: JLCPCB Part URL; ComponentLink2URL: https://jlcpcb.com/partdetail/C113873; ComponentLink3Description: LCSC Part URL; ComponentLink3URL: https://lcsc.com/product-detail/Multilayer-Ceramic-Capacitors-MLCC---SMD-SMT_YAGEO-YAGEO-CC1206JKNPOCBN121_C113873.html
footprint CAP-1206 (1206 (3216M) Capacitor)
pins: 1, 2

## CC1206JKNPOCBN150
designator C?  Capacitance: 15pF  (hidden comment: *)
Capacitor, Ceramic (MLCC), 15pF, ±5%, 1kV, NP0, ±5%, SMD 1206; Manufacturer: YAGEO; Manufacturer Part Number: CC1206JKNPOCBN150; Package Size: 1206; JLCPCB Basic Part: No; JLCPCB Part Number: C326650; Supplier 1: LCSC; Category: Capacitors - MLCC; Supplier Part Number 1: C326650; Tolerance: ±5%; Voltage Rating: 1kV; Temperature Coefficient: NP0; RoHS: Yes; ComponentLink1Description: Datasheet; ComponentLink1URL: https://wmsc.lcsc.com/wmsc/upload/file/pdf/v2/lcsc/1811141242_YAGEO-CC1206JKNPOCBN150_C326650.pdf; ComponentLink2Description: JLCPCB Part URL; ComponentLink2URL: https://jlcpcb.com/partdetail/C326650; ComponentLink3Description: LCSC Part URL; ComponentLink3URL: https://lcsc.com/product-detail/Multilayer-Ceramic-Capacitors-MLCC---SMD-SMT_YAGEO-YAGEO-CC1206JKNPOCBN150_C326650.html
footprint CAP-1206 (1206 (3216M) Capacitor)
pins: 1, 2

## CC1206JKNPOCBN151
designator C?  Capacitance: 150pF  (hidden comment: *)
Capacitor, Ceramic (MLCC), 150pF, ±5%, 1kV, NP0, ±5%, SMD 1206; Manufacturer: YAGEO; Manufacturer Part Number: CC1206JKNPOCBN151; Package Size: 1206; JLCPCB Basic Part: No; JLCPCB Part Number: C326703; Supplier 1: LCSC; Category: Capacitors - MLCC; Supplier Part Number 1: C326703; Tolerance: ±5%; Voltage Rating: 1kV; Temperature Coefficient: NP0; RoHS: Yes; ComponentLink1Description: Datasheet; ComponentLink1URL: https://wmsc.lcsc.com/wmsc/upload/file/pdf/v2/lcsc/1811141240_YAGEO-CC1206JKNPOCBN151_C326703.pdf; ComponentLink2Description: JLCPCB Part URL; ComponentLink2URL: https://jlcpcb.com/partdetail/C326703; ComponentLink3Description: LCSC Part URL; ComponentLink3URL: https://lcsc.com/product-detail/Multilayer-Ceramic-Capacitors-MLCC---SMD-SMT_YAGEO-YAGEO-CC1206JKNPOCBN151_C326703.html
footprint CAP-1206 (1206 (3216M) Capacitor)
pins: 1, 2

## CC1206JKNPOCBN180
designator C?  Capacitance: 18pF  (hidden comment: *)
Capacitor, Ceramic (MLCC), 18pF, ±5%, 1kV, NP0, ±5%, SMD 1206; Manufacturer: YAGEO; Manufacturer Part Number: CC1206JKNPOCBN180; Package Size: 1206; JLCPCB Basic Part: No; JLCPCB Part Number: C326061; Supplier 1: LCSC; Category: Capacitors - MLCC; Supplier Part Number 1: C326061; Tolerance: ±5%; Voltage Rating: 1kV; Temperature Coefficient: NP0; RoHS: Yes; ComponentLink1Description: Datasheet; ComponentLink1URL: https://wmsc.lcsc.com/wmsc/upload/file/pdf/v2/lcsc/1811031143_YAGEO-CC1206JKNPOCBN180_C326061.pdf; ComponentLink2Description: JLCPCB Part URL; ComponentLink2URL: https://jlcpcb.com/partdetail/C326061; ComponentLink3Description: LCSC Part URL; ComponentLink3URL: https://lcsc.com/product-detail/Multilayer-Ceramic-Capacitors-MLCC---SMD-SMT_YAGEO-YAGEO-CC1206JKNPOCBN180_C326061.html
footprint CAP-1206 (1206 (3216M) Capacitor)
pins: 1, 2

## CC1206JKNPOCBN181
designator C?  Capacitance: 180pF  (hidden comment: *)
Capacitor, Ceramic (MLCC), 180pF, ±5%, 1kV, NP0, ±5%, SMD 1206; Manufacturer: YAGEO; Manufacturer Part Number: CC1206JKNPOCBN181; Package Size: 1206; JLCPCB Basic Part: No; JLCPCB Part Number: C541494; Supplier 1: LCSC; Category: Capacitors - MLCC; Supplier Part Number 1: C541494; Tolerance: ±5%; Voltage Rating: 1kV; Temperature Coefficient: NP0; RoHS: Yes; ComponentLink1Description: Datasheet; ComponentLink1URL: https://wmsc.lcsc.com/wmsc/upload/file/pdf/v2/lcsc/2006151141_YAGEO-CC1206JKNPOCBN181_C541494.pdf; ComponentLink2Description: JLCPCB Part URL; ComponentLink2URL: https://jlcpcb.com/partdetail/C541494; ComponentLink3Description: LCSC Part URL; ComponentLink3URL: https://lcsc.com/product-detail/Multilayer-Ceramic-Capacitors-MLCC---SMD-SMT_YAGEO-YAGEO-CC1206JKNPOCBN181_C541494.html
footprint CAP-1206 (1206 (3216M) Capacitor)
pins: 1, 2

## CC1206JKNPOCBN220
designator C?  Capacitance: 22pF  (hidden comment: *)
Capacitor, Ceramic (MLCC), 22pF, ±5%, 1kV, NP0, ±5%, SMD 1206; Manufacturer: YAGEO; Manufacturer Part Number: CC1206JKNPOCBN220; Package Size: 1206; JLCPCB Basic Part: No; JLCPCB Part Number: C107174; Supplier 1: LCSC; Category: Capacitors - MLCC; Supplier Part Number 1: C107174; Tolerance: ±5%; Voltage Rating: 1kV; Temperature Coefficient: NP0; RoHS: Yes; ComponentLink1Description: Datasheet; ComponentLink1URL: https://wmsc.lcsc.com/wmsc/upload/file/pdf/v2/lcsc/2304140030_YAGEO-CC1206JKNPOCBN220_C107174.pdf; ComponentLink2Description: JLCPCB Part URL; ComponentLink2URL: https://jlcpcb.com/partdetail/C107174; ComponentLink3Description: LCSC Part URL; ComponentLink3URL: https://lcsc.com/product-detail/Multilayer-Ceramic-Capacitors-MLCC---SMD-SMT_YAGEO-YAGEO-CC1206JKNPOCBN220_C107174.html
footprint CAP-1206 (1206 (3216M) Capacitor)
pins: 1, 2

## CC1206JKNPOCBN221
designator C?  Capacitance: 220pF  (hidden comment: *)
Capacitor, Ceramic (MLCC), 220pF, ±5%, 1kV, NP0, ±5%, SMD 1206; Manufacturer: YAGEO; Manufacturer Part Number: CC1206JKNPOCBN221; Package Size: 1206; JLCPCB Basic Part: No; JLCPCB Part Number: C107175; Supplier 1: LCSC; Category: Capacitors - MLCC; Supplier Part Number 1: C107175; Tolerance: ±5%; Voltage Rating: 1kV; Temperature Coefficient: NP0; RoHS: Yes; ComponentLink1Description: Datasheet; ComponentLink1URL: https://wmsc.lcsc.com/wmsc/upload/file/pdf/v2/lcsc/2304140030_YAGEO-CC1206JKNPOCBN221_C107175.pdf; ComponentLink2Description: JLCPCB Part URL; ComponentLink2URL: https://jlcpcb.com/partdetail/C107175; ComponentLink3Description: LCSC Part URL; ComponentLink3URL: https://lcsc.com/product-detail/Multilayer-Ceramic-Capacitors-MLCC---SMD-SMT_YAGEO-YAGEO-CC1206JKNPOCBN221_C107175.html
footprint CAP-1206 (1206 (3216M) Capacitor)
pins: 1, 2

## CC1206JKNPOCBN270
designator C?  Capacitance: 27pF  (hidden comment: *)
Capacitor, Ceramic (MLCC), 27pF, ±5%, 1kV, NP0, ±5%, SMD 1206; Manufacturer: YAGEO; Manufacturer Part Number: CC1206JKNPOCBN270; Package Size: 1206; JLCPCB Basic Part: No; JLCPCB Part Number: C541492; Supplier 1: LCSC; Category: Capacitors - MLCC; Supplier Part Number 1: C541492; Tolerance: ±5%; Voltage Rating: 1kV; Temperature Coefficient: NP0; RoHS: Yes; ComponentLink1Description: Datasheet; ComponentLink1URL: https://wmsc.lcsc.com/wmsc/upload/file/pdf/v2/lcsc/2006151141_YAGEO-CC1206JKNPOCBN270_C541492.pdf; ComponentLink2Description: JLCPCB Part URL; ComponentLink2URL: https://jlcpcb.com/partdetail/C541492; ComponentLink3Description: LCSC Part URL; ComponentLink3URL: https://lcsc.com/product-detail/Multilayer-Ceramic-Capacitors-MLCC---SMD-SMT_YAGEO-YAGEO-CC1206JKNPOCBN270_C541492.html
footprint CAP-1206 (1206 (3216M) Capacitor)
pins: 1, 2

## CC1206JKNPOCBN271
designator C?  Capacitance: 270pF  (hidden comment: *)
Capacitor, Ceramic (MLCC), 270pF, ±5%, 1kV, NP0, ±5%, SMD 1206; Manufacturer: YAGEO; Manufacturer Part Number: CC1206JKNPOCBN271; Package Size: 1206; JLCPCB Basic Part: No; JLCPCB Part Number: C113874; Supplier 1: LCSC; Category: Capacitors - MLCC; Supplier Part Number 1: C113874; Tolerance: ±5%; Voltage Rating: 1kV; Temperature Coefficient: NP0; RoHS: Yes; ComponentLink1Description: Datasheet; ComponentLink1URL: https://wmsc.lcsc.com/wmsc/upload/file/pdf/v2/lcsc/2304140030_YAGEO-CC1206JKNPOCBN271_C113874.pdf; ComponentLink2Description: JLCPCB Part URL; ComponentLink2URL: https://jlcpcb.com/partdetail/C113874; ComponentLink3Description: LCSC Part URL; ComponentLink3URL: https://lcsc.com/product-detail/Multilayer-Ceramic-Capacitors-MLCC---SMD-SMT_YAGEO-YAGEO-CC1206JKNPOCBN271_C113874.html
footprint CAP-1206 (1206 (3216M) Capacitor)
pins: 1, 2

## CC1206JKNPOCBN330
designator C?  Capacitance: 33pF  (hidden comment: *)
Capacitor, Ceramic (MLCC), 33pF, ±5%, 1kV, NP0, ±5%, SMD 1206; Manufacturer: YAGEO; Manufacturer Part Number: CC1206JKNPOCBN330; Package Size: 1206; JLCPCB Basic Part: No; JLCPCB Part Number: C85570; Supplier 1: LCSC; Category: Capacitors - MLCC; Supplier Part Number 1: C85570; Tolerance: ±5%; Voltage Rating: 1kV; Temperature Coefficient: NP0; RoHS: Yes; ComponentLink1Description: Datasheet; ComponentLink1URL: https://wmsc.lcsc.com/wmsc/upload/file/pdf/v2/lcsc/2304140030_YAGEO-CC1206JKNPOCBN330_C85570.pdf; ComponentLink2Description: JLCPCB Part URL; ComponentLink2URL: https://jlcpcb.com/partdetail/C85570; ComponentLink3Description: LCSC Part URL; ComponentLink3URL: https://lcsc.com/product-detail/Multilayer-Ceramic-Capacitors-MLCC---SMD-SMT_YAGEO-YAGEO-CC1206JKNPOCBN330_C85570.html
footprint CAP-1206 (1206 (3216M) Capacitor)
pins: 1, 2

## CC1206JKNPOCBN331
designator C?  Capacitance: 330pF  (hidden comment: *)
Capacitor, Ceramic (MLCC), 330pF, ±5%, 1kV, NP0, ±5%, SMD 1206; Manufacturer: YAGEO; Manufacturer Part Number: CC1206JKNPOCBN331; Package Size: 1206; JLCPCB Basic Part: No; JLCPCB Part Number: C541495; Supplier 1: LCSC; Category: Capacitors - MLCC; Supplier Part Number 1: C541495; Tolerance: ±5%; Voltage Rating: 1kV; Temperature Coefficient: NP0; RoHS: Yes; ComponentLink1Description: Datasheet; ComponentLink1URL: https://wmsc.lcsc.com/wmsc/upload/file/pdf/v2/lcsc/2006151141_YAGEO-CC1206JKNPOCBN331_C541495.pdf; ComponentLink2Description: JLCPCB Part URL; ComponentLink2URL: https://jlcpcb.com/partdetail/C541495; ComponentLink3Description: LCSC Part URL; ComponentLink3URL: https://lcsc.com/product-detail/Multilayer-Ceramic-Capacitors-MLCC---SMD-SMT_YAGEO-YAGEO-CC1206JKNPOCBN331_C541495.html
footprint CAP-1206 (1206 (3216M) Capacitor)
pins: 1, 2

## CC1206JKNPOCBN390
designator C?  Capacitance: 39pF  (hidden comment: *)
Capacitor, Ceramic (MLCC), 39pF, ±5%, 1kV, NP0, ±5%, SMD 1206; Manufacturer: YAGEO; Manufacturer Part Number: CC1206JKNPOCBN390; Package Size: 1206; JLCPCB Basic Part: No; JLCPCB Part Number: C541493; Supplier 1: LCSC; Category: Capacitors - MLCC; Supplier Part Number 1: C541493; Tolerance: ±5%; Voltage Rating: 1kV; Temperature Coefficient: NP0; RoHS: Yes; ComponentLink1Description: Datasheet; ComponentLink1URL: https://wmsc.lcsc.com/wmsc/upload/file/pdf/v2/lcsc/2006151141_YAGEO-CC1206JKNPOCBN390_C541493.pdf; ComponentLink2Description: JLCPCB Part URL; ComponentLink2URL: https://jlcpcb.com/partdetail/C541493; ComponentLink3Description: LCSC Part URL; ComponentLink3URL: https://lcsc.com/product-detail/Multilayer-Ceramic-Capacitors-MLCC---SMD-SMT_YAGEO-YAGEO-CC1206JKNPOCBN390_C541493.html
footprint CAP-1206 (1206 (3216M) Capacitor)
pins: 1, 2

## CC1206JKNPOCBN391
designator C?  Capacitance: 390pF  (hidden comment: *)
Capacitor, Ceramic (MLCC), 390pF, ±5%, 1kV, NP0, ±5%, SMD 1206; Manufacturer: YAGEO; Manufacturer Part Number: CC1206JKNPOCBN391; Package Size: 1206; JLCPCB Basic Part: No; JLCPCB Part Number: C326659; Supplier 1: LCSC; Category: Capacitors - MLCC; Supplier Part Number 1: C326659; Tolerance: ±5%; Voltage Rating: 1kV; Temperature Coefficient: NP0; RoHS: Yes; ComponentLink1Description: Datasheet; ComponentLink1URL: https://wmsc.lcsc.com/wmsc/upload/file/pdf/v2/lcsc/1811141240_YAGEO-CC1206JKNPOCBN391_C326659.pdf; ComponentLink2Description: JLCPCB Part URL; ComponentLink2URL: https://jlcpcb.com/partdetail/C326659; ComponentLink3Description: LCSC Part URL; ComponentLink3URL: https://lcsc.com/product-detail/Multilayer-Ceramic-Capacitors-MLCC---SMD-SMT_YAGEO-YAGEO-CC1206JKNPOCBN391_C326659.html
footprint CAP-1206 (1206 (3216M) Capacitor)
pins: 1, 2

## CC1206JKNPOCBN470
designator C?  Capacitance: 47pF  (hidden comment: *)
Capacitor, Ceramic (MLCC), 47pF, ±5%, 1kV, NP0, ±5%, SMD 1206; Manufacturer: YAGEO; Manufacturer Part Number: CC1206JKNPOCBN470; Package Size: 1206; JLCPCB Basic Part: No; JLCPCB Part Number: C107176; Supplier 1: LCSC; Category: Capacitors - MLCC; Supplier Part Number 1: C107176; Tolerance: ±5%; Voltage Rating: 1kV; Temperature Coefficient: NP0; RoHS: Yes; ComponentLink1Description: Datasheet; ComponentLink1URL: https://wmsc.lcsc.com/wmsc/upload/file/pdf/v2/lcsc/2304140030_YAGEO-CC1206JKNPOCBN470_C107176.pdf; ComponentLink2Description: JLCPCB Part URL; ComponentLink2URL: https://jlcpcb.com/partdetail/C107176; ComponentLink3Description: LCSC Part URL; ComponentLink3URL: https://lcsc.com/product-detail/Multilayer-Ceramic-Capacitors-MLCC---SMD-SMT_YAGEO-YAGEO-CC1206JKNPOCBN470_C107176.html
footprint CAP-1206 (1206 (3216M) Capacitor)
pins: 1, 2
